# Altium footprint library AltiumDesignerLibraries.PcbLib: 313 footprints (part 5 of 20)
Each footprint in its own frame and in the unit in brackets; x right, y up, seen from the top. Pads: shape width x height; smd on the part's side, far side on the other; paste and mask are expansions set on the pad; w line width, h text height; cw(c..) or ccw(c..) is an arc to the next point about the centre after c.
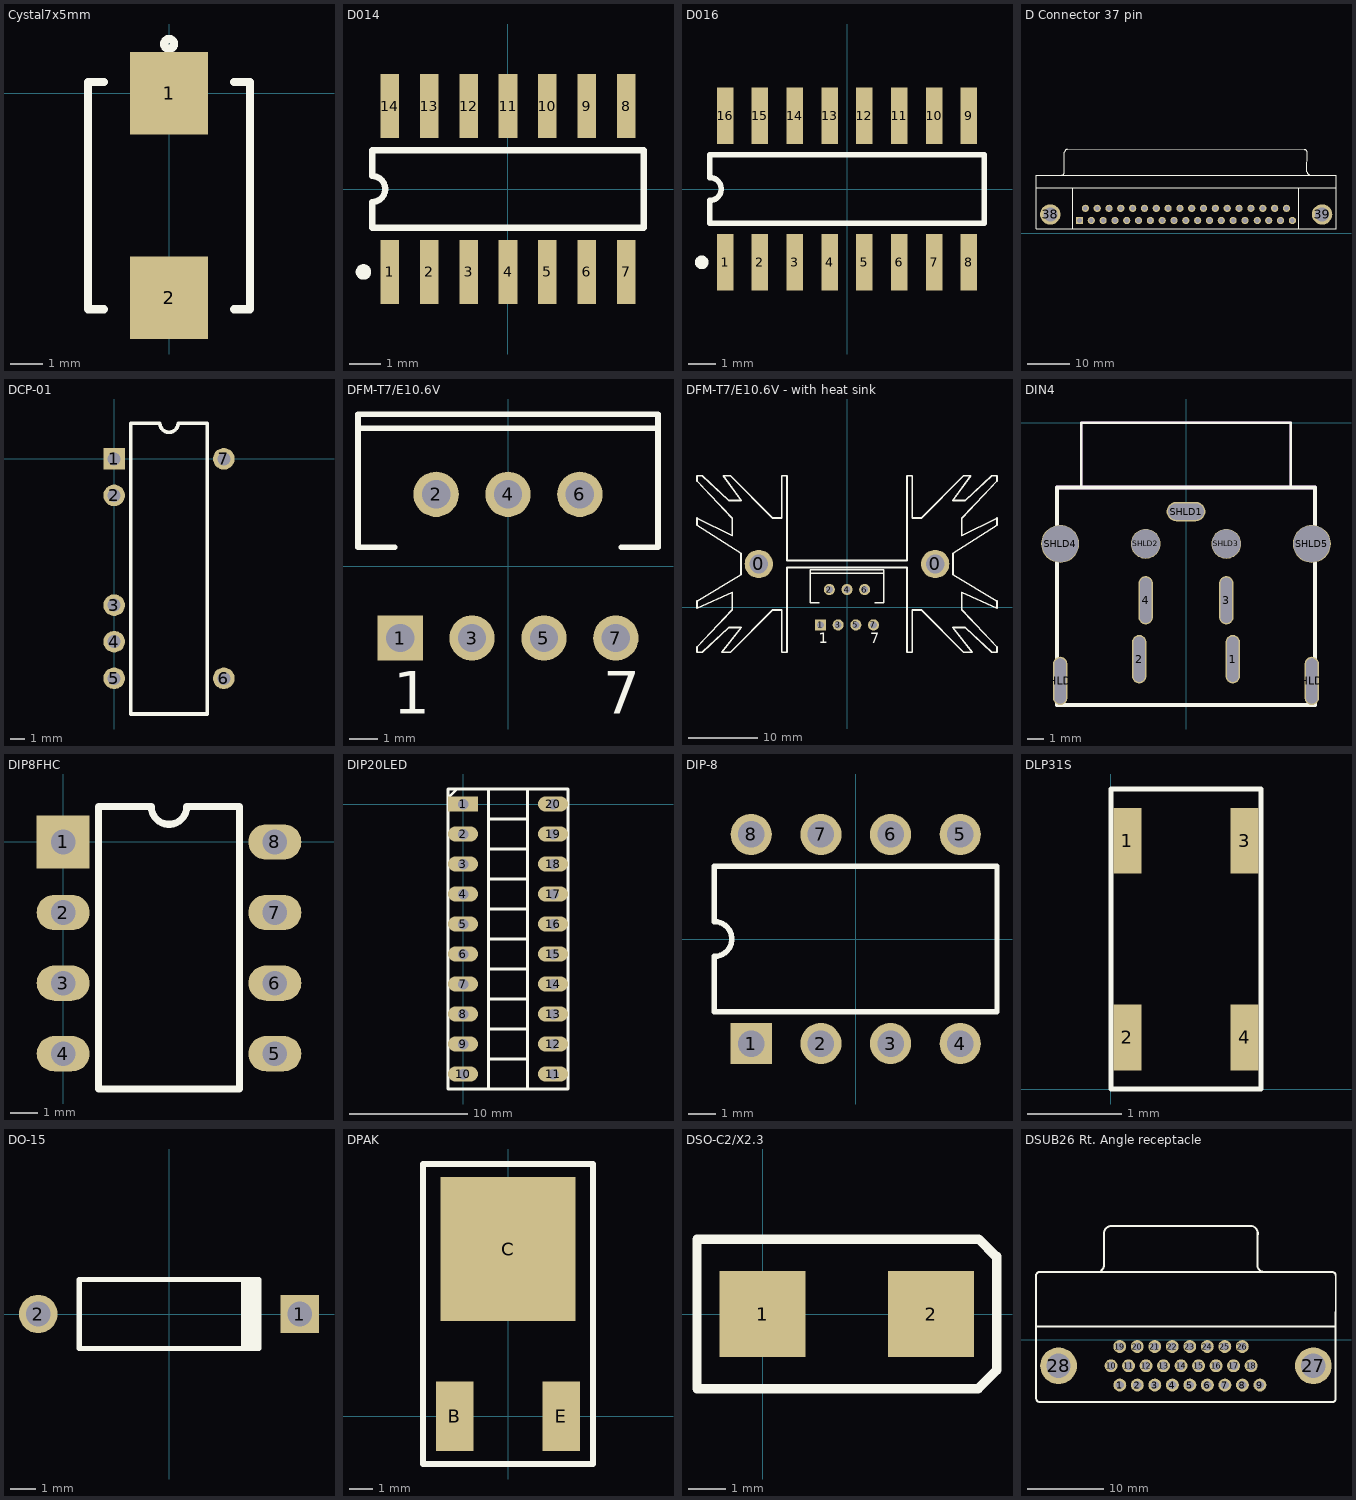
[diagram p4: the footprints below, top view; thin cyan lines are the x and y axes]

## Cystal7x5mm [mm] "7mm x 5mm cystal footprint"
pads (2):
  rect 2.4x2.54 smd: 1(0,0) 2(0,-6.3)
Top Overlay:
  circle w0.254: c0,1.524 r0.152
  lines w0.254: -2,-6.65 -2.5,-6.65 -2.5,0.35 -2,0.35 ; 2,-6.65 2.5,-6.65 2.5,0.35 2,0.35

## D014 [mm]
pads (14):
  rect 0.6x2.05 smd: 1(-3.81,-2.675) 2(-2.54,-2.675) 3(-1.27,-2.675) 4(0,-2.675) 5(1.27,-2.675) 6(2.54,-2.675) 7(3.81,-2.675) 8(3.81,2.675) 9(2.54,2.675) 10(1.27,2.675) 11(0,2.675) 12(-1.27,2.675) 13(-2.54,2.675) 14(-3.81,2.675)
Top Overlay:
  circle w0.25: c-4.66,-2.675 r0.125
  lines w0.2: -4.375,-1.25 4.375,-1.25 4.375,1.25 -4.375,1.25 -4.375,0.417 cw(c-4.375,0) -4.375,-0.417 -4.375,-1.25

## D016 [mm]
pads (16):
  rect 0.6x2.05 smd: 1(-4.445,-2.675) 2(-3.175,-2.675) 3(-1.905,-2.675) 4(-0.635,-2.675) 5(0.635,-2.675) 6(1.905,-2.675) 7(3.175,-2.675) 8(4.445,-2.675) 9(4.445,2.675) 10(3.175,2.675) 11(1.905,2.675) 12(0.635,2.675) 13(-0.635,2.675) 14(-1.905,2.675) 15(-3.175,2.675) 16(-4.445,2.675)
Top Overlay:
  circle w0.25: c-5.295,-2.675 r0.125
  lines w0.2: -5,-1.25 -5,-0.417 ccw(c-5,0) -5,0.417 -5,1.25 5,1.25 5,-1.25 -5,-1.25

## D Connector 37 pin [mm]
pads (39):
  rect 1.69x1.69 hole 1.09: 1(24.996,2.974)
  round 1.69 hole 1.09: 2(27.757,2.974) 3(30.518,2.974) 4(33.279,2.974) 5(36.04,2.974) 6(38.801,2.974) 7(41.562,2.974) 8(44.323,2.974) 9(47.084,2.974) 10(49.845,2.974) 11(52.606,2.974) 12(55.367,2.974) 13(58.128,2.974) 14(60.898,2.974) 15(63.668,2.974) 16(66.546,2.974) 17(69.208,2.974) 18(71.978,2.974) 19(74.748,2.974) 20(26.377,5.814) 21(29.138,5.814) 22(31.899,5.814) 23(34.66,5.814) 24(37.421,5.814) 25(40.182,5.814) 26(42.943,5.814) 27(45.704,5.814) 28(48.465,5.814) 29(51.226,5.814) 30(53.987,5.814) 31(56.748,5.814) 32(59.518,5.814) 33(62.288,5.814) 34(65.058,5.814) 35(67.828,5.814) 36(70.598,5.814) 37(73.368,5.814)
  round 4.76 hole 3.26: 38(18.186,4.394) 39(81.686,4.394)
Top Overlay:
  lines w0.2: 14.836,10.589 84.886,10.594 ; 20.791,13.594 ccw(c20.791,14.289) 21.486,14.289 21.486,18.889 ; 21.491,18.894 cw(c22.186,18.894) 22.186,19.589 ; 22.149,19.583 77.513,19.569 ; 23.386,1.089 23.386,10.589 ; 76.286,1.089 76.286,10.589 ; 77.512,19.567 cw(c77.512,18.872) 78.207,18.872 ; 78.156,14.351 78.162,19.094 ; 78.156,14.376 ccw(c78.851,14.376) 78.851,13.681 ; 14.836,1.089 84.936,1.089 84.936,13.589 14.836,13.589 14.836,1.089
3D body: height 12.51, standoff -4.25, extent 14.732,0.978 84.125,19.24

## DCP-01 [mm]
height 2.54
pads (7):
  rect 1.5x1.5 hole 0.9: 1(0,0)
  round 1.5 hole 0.9: 2(0,-2.54) 3(0,-10.16) 4(0,-12.7) 5(0,-15.24) 6(7.62,-15.24) 7(7.62,0)
Top Overlay:
  lines w0.25: 1.16,-17.72 1.16,2.48 3.175,2.48 ccw(c3.81,2.48) 4.445,2.48 6.46,2.48 6.46,-17.72 1.16,-17.72

## DFM-T7/E10.6V [mm] "TA07B"
pads (7):
  rect 1.6x1.6 hole 1: 1(-3.81,-2.54)
  round 1.6 hole 1: 2(-2.54,2.54) 3(-1.27,-2.54) 4(0,2.54) 5(1.27,-2.54) 6(2.54,2.54) 7(3.81,-2.54)
Top Overlay:
  lines w0.2: -5.3,4.87 5.3,4.87 ; -4,0.67 -5.3,0.67 -5.3,5.37 5.3,5.37 5.3,0.67 4,0.67
  text "7" at 3.36,-5.215 h1.5
  text "1" at -4.06,-5.215 h1.5

## DFM-T7/E10.6V - with heat sink [mm] "TA07B   with digikey PN HS188-ND heat sink"
height 38.1
pads (9):
  round 4.064 hole 2.667: 0(-12.7,6.223) 0(12.7,6.223)
  rect 1.6x1.6 hole 1: 1(-3.81,-2.54)
  round 1.6 hole 1: 2(-2.54,2.54) 3(-1.27,-2.54) 4(0,2.54) 5(1.27,-2.54) 6(2.54,2.54) 7(3.81,-2.54)
Top Overlay:
  lines w0.2: -5.3,4.87 5.3,4.87 ; -4,0.67 -5.3,0.67 -5.3,5.37 5.3,5.37 5.3,0.67 4,0.67
  lines w0.254: -21.59,-6.477 -20.828,-6.477 -17.018,-2.921 -15.24,-2.921 -18.034,-6.477 -16.764,-6.477 -10.668,-0.381 -9.398,-0.381 -9.398,-6.477 -8.636,-6.477 -8.636,5.715 8.636,5.715 8.636,-6.477 9.398,-6.477 9.398,-0.381 10.668,-0.381 16.764,-6.477 18.034,-6.477 15.24,-2.921 17.018,-2.921 20.828,-6.477 21.59,-6.477 21.59,-5.715 16.51,-0.381 16.51,2.159 21.59,-0.127 21.59,0.889 15.24,4.699 15.24,7.747 21.59,11.811 21.59,12.827 16.51,10.287 16.51,12.827 21.59,18.161 21.59,18.923 20.828,18.923 17.018,15.367 15.24,15.367 17.78,18.923 16.764,18.923 10.668,12.827 9.398,12.827 9.398,18.923 8.636,18.923 8.636,6.731 -8.636,6.731 -8.636,18.923 -9.398,18.923 -9.398,12.827 -10.668,12.827 -16.764,18.923 -17.78,18.923 -15.24,15.367 -17.018,15.367 -20.828,18.923 -21.59,18.923 -21.59,18.161 -16.51,12.827 -16.51,10.287 -21.59,12.827 -21.59,11.811 -15.24,7.747 -15.24,4.699 -21.59,0.889 -21.59,-0.127 -16.51,2.159 -16.51,-0.381 -21.59,-5.715 -21.59,-6.477
  text "1" at -4.06,-5.215 h1.5
  text "7" at 3.36,-5.215 h1.5

## DIN4 [mm] "Power DIN 4"
height 14.4
pads (11):
  oval 0.9x3 hole 0.7 slot 2.8 at 90 deg: 1(2.9,-14.65) 2(-2.9,-14.65) 3(2.5,-11) 4(-2.5,-11) SHLD6(7.8,-16) SHLD7(-7.8,-16)
  oval 2.4x1.2 hole 1 slot 2.2 at 0 deg: SHLD1(0,-5.5)
  round 1.85 hole 1.75: SHLD2(-2.5,-7.5) SHLD3(2.5,-7.5)
  round 2.35 hole 2.25: SHLD4(-7.8,-7.5) SHLD5(7.8,-7.5)
Top Overlay:
  lines w0.164: -6.5,-4 -6.5,0 0,0 6.5,0 6.5,-4
  lines w0.254: -8,-17.5 8,-17.5 8,-4 -8,-4 -8,-17.5
Mechanical 13:
  lines w0.164: -6.5,-0.05 -6.5,-4 6.5,-4 6.5,0 -6.45,0
  lines w0.254: -8,-17.5 -8,-4 8,-4 8,-17.5 -8,-17.5
3D body: height 14.4, standoff 0, extent -7.999,-17.499 7.999,-4.001
3D body: height 13, standoff 0.6, extent -6.499,-3.999 6.499,-0.001

## DIP8FHC [mil]
pads (8):
  rect 75x75 hole 35: 1(0,0)
  oval 75x50 hole 35: 2(0,-100) 3(0,-200) 4(0,-300) 5(300,-300) 6(300,-200) 7(300,-100) 8(300,0)
Top Overlay:
  lines w10: 50,-350 250,-350 250,50 175,50 cw(c150,50) 125,50 50,50 50,-350

## DIP20LED [mil]
pads (20):
  rect 100x50 hole 35: 1(0,0)
  oval 100x50 hole 35: 2(0,-100) 3(0,-200) 4(0,-300) 5(0,-400) 6(0,-500) 7(0,-600) 8(0,-700) 9(0,-800) 10(0,-900) 11(300,-900) 12(300,-800) 13(300,-700) 14(300,-600) 15(300,-500) 16(300,-400) 17(300,-300) 18(300,-200) 19(300,-100) 20(300,0)
Top Overlay:
  lines w10: -50,20 -20,50 ; 85,-850 215,-850 ; 85,-750 215,-750 ; 85,-650 215,-650 ; 85,-550 215,-550 ; 85,-450 215,-450 ; 85,-350 215,-350 ; 85,-250 215,-250 ; 85,-150 215,-150 ; 85,-50 215,-50 ; 125,50 85,50 85,-950 215,-950 215,50 175,50 ; -50,-950 -50,50 350,50 350,-950 -50,-950

## DIP-8 [mm]
pads (8):
  rect 1.5x1.5 hole 0.965: 1(-3.81,-3.81)
  round 1.5 hole 0.965: 2(-1.27,-3.81) 3(1.27,-3.81) 4(3.81,-3.81) 5(3.81,3.81) 6(1.27,3.81) 7(-1.27,3.81) 8(-3.81,3.81)
Top Overlay:
  lines w0.2: -5.15,-2.65 -5.15,-0.635 ccw(c-5.15,0) -5.15,0.635 -5.15,2.65 5.15,2.65 5.15,-2.65 -5.15,-2.65

## DLP31S [mm] "Common Mode Choke Coil"
height 1.15
pads (4):
  rect 0.3x0.7 smd: 1(0.175,2.65) 2(0.175,0.55) 3(1.425,2.65) 4(1.425,0.55)
Top Overlay:
  lines w0.05: 0,0 0,3.2 1.6,3.2 1.6,0 0,0

## DO-15 [mm] "Diode footprint 250mil body"
pads (2):
  rect 1.5x1.5 hole 0.965: 1(5.1,0)
  round 1.5 hole 0.965: 2(-5.1,0)
Top Overlay:
  rectangle: 2.8,-1.35 3.6,1.35
  lines w0.2: 3.5,-1.35 -3.5,-1.35 -3.5,1.35 3.5,1.35

## DPAK [mil]
pads (3):
  rect 63x118 smd: B(-90,0) E(90,0)
  rect 228x244 smd: C(0,283)
Top Overlay:
  lines w10: -144,-81 144,-81 144,427 -144,427 -144,-81

## DSO-C2/X2.3 [mm]
pads (2):
  rect 2.3x2.3 smd: 1(0,0) 2(4.5,0)
Top Overlay:
  lines w0.25: 5.76,-2 -1.75,-2 -1.75,2 5.76,2 ; 5.76,-1.99 6.26,-1.49 ; 5.77,2 6.22,1.55 ; 6.25,-1.5 6.25,1.54

## DSUB26 Rt. Angle receptacle [mm]
pads (28):
  round 1.69 hole 1.09: 1(14.566,-5.917) 2(16.856,-5.917) 3(19.146,-5.917) 4(21.436,-5.917) 5(23.726,-5.917) 6(26.016,-5.917) 7(28.306,-5.917) 8(30.596,-5.917) 9(32.886,-5.917) 10(13.416,-3.404) 11(15.706,-3.404) 12(17.996,-3.404) 13(20.286,-3.404) 14(22.576,-3.404) 15(24.866,-3.404) 16(27.156,-3.404) 17(29.446,-3.404) 18(31.736,-3.404) 19(14.556,-0.89) 20(16.846,-0.89) 21(19.136,-0.89) 22(21.426,-0.89) 23(23.716,-0.89) 24(26.006,-0.89) 25(28.296,-0.89) 26(30.586,-0.89)
  round 4.8 hole 3.18: 27(39.876,-3.404) 28(6.556,-3.404)
Top Overlay:
  lines w0.254: 3.607,-7.648 3.607,8.357 cw(c4.115,8.357) 4.115,8.865 ; 3.607,1.727 37.262,1.727 42.799,1.727 ; 3.63,-7.671 ccw(c4.127,-7.658) 4.14,-8.156 ; 3.988,-8.153 42.342,-8.153 ccw(c42.329,-7.648) 42.775,-7.887 42.784,-0.906 42.8,8.382 ccw(c42.316,8.382) 42.291,8.865 ; 4.128,8.866 42.252,8.866 ; 11.943,8.859 ccw(c11.214,9.958) 12.497,9.652 12.497,14.072 cw(c13.466,13.881) 13.624,14.857 31.877,14.859 cw(c31.623,13.894) 32.588,13.64 ; 32.563,14.122 32.563,9.703 ccw(c33.464,9.767) 33.528,8.866
3D body: height 4.03, standoff -12.55, extent 3.668,-7.207 42.834,14.955